# Altium footprint library PartsDatabaseV16.1.PcbLib: 145 footprints (part 6 of 10)
Each footprint in its own frame and in the unit in brackets; x right, y up, seen from the top. Pads: shape width x height; smd on the part's side, far side on the other; paste and mask are expansions set on the pad; w line width, h text height; cw(c..) or ccw(c..) is an arc to the next point about the centre after c.
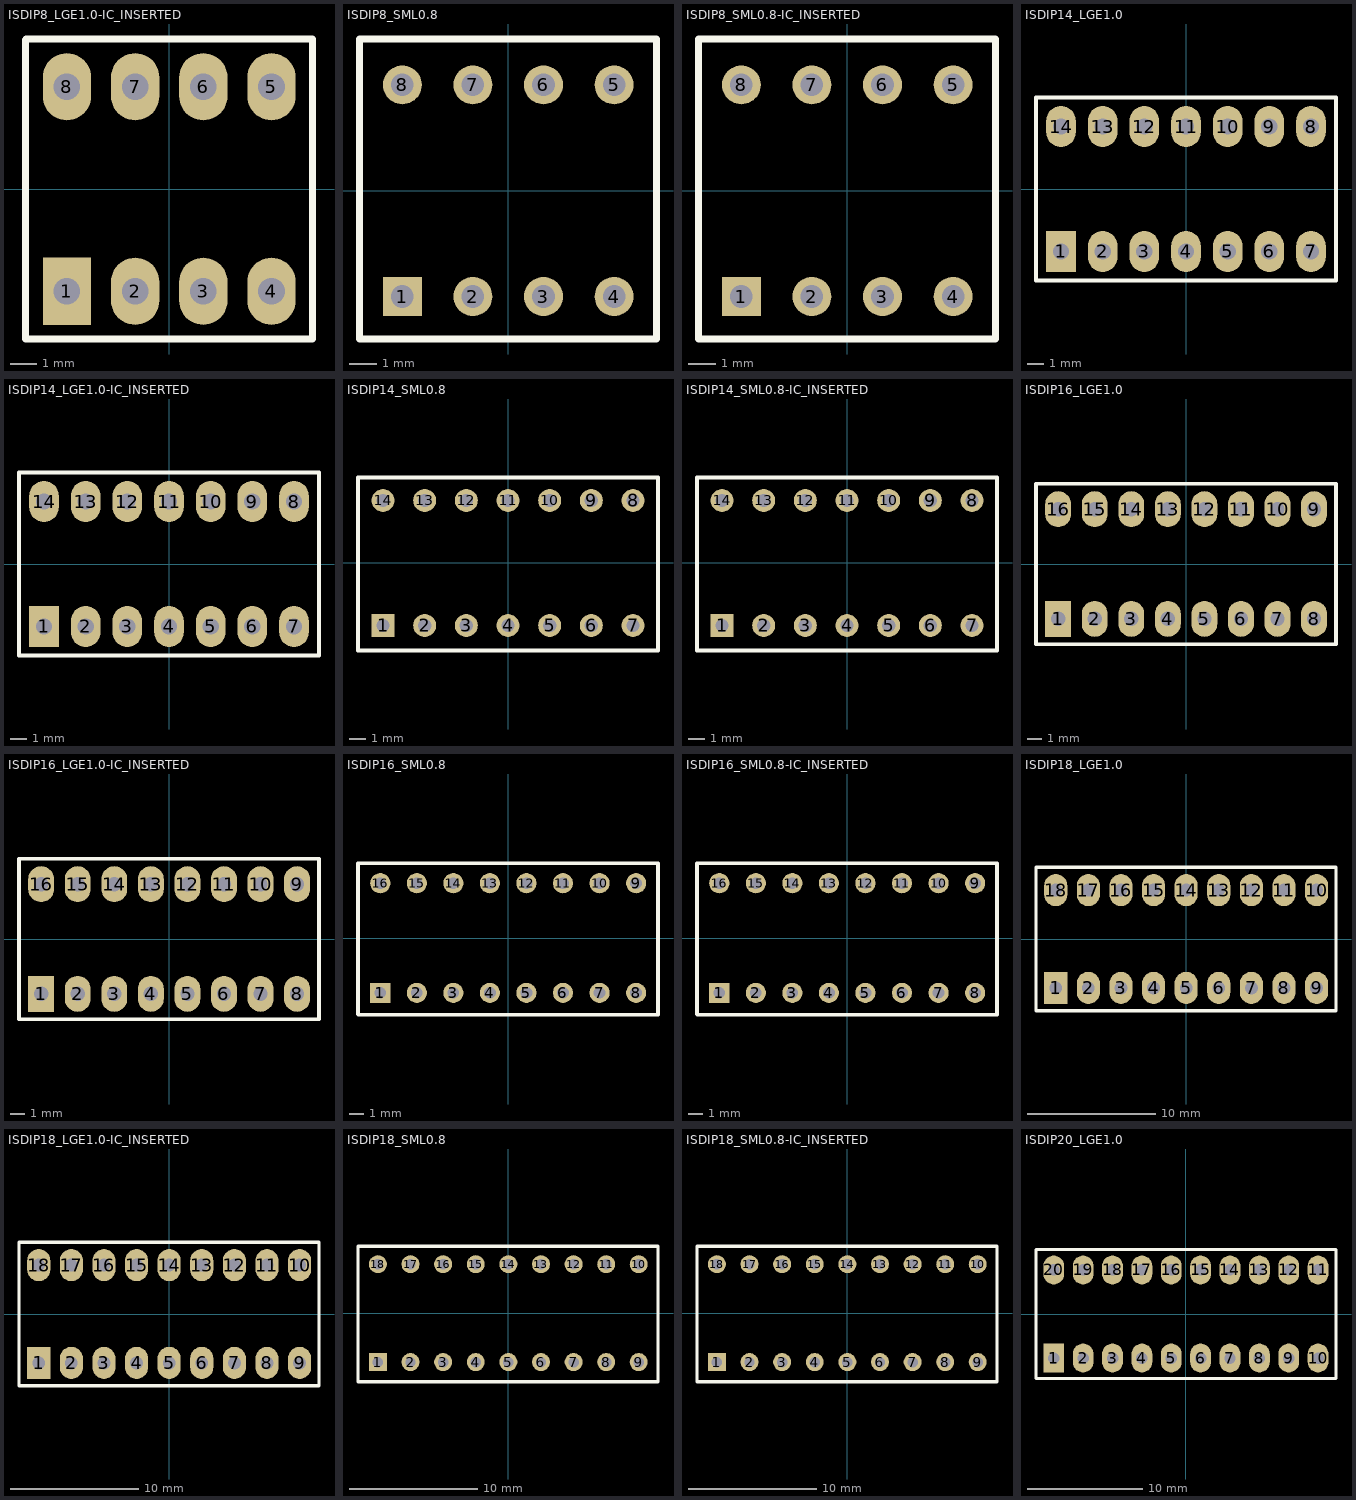
[diagram p5: the footprints below, top view; thin cyan lines are the x and y axes]

## ISDIP8_LGE1.0-IC_INSERTED [mm] "DIP; 8 Rectangular Pins; Row Space 7.62 mm; Pitch 2.54 mm"
height 11.94
pads (8):
  rect 1.8x2.5 hole 0.991: 1(-3.81,-3.81)
  oval 1.8x2.5 hole 0.991: 2(-1.27,-3.81) 3(1.27,-3.81) 4(3.81,-3.81) 5(3.81,3.81) 6(1.27,3.81) 7(-1.27,3.81) 8(-3.81,3.81)
Top Overlay:
  lines w0.25: -5.35,5.563 -5.35,3.175 -5.35,-5.588 5.334,-5.588 5.334,5.588 -5.334,5.588
3D body "DIP8.step": height 8, standoff 1.14, extent -5.664,-4.089 5.766,3.785
3D body "DIP8_socket.step": height 5, standoff -3, extent -5.105,-5.131 5.055,5.029

## ISDIP8_SML0.8 [mm] "DIP; 8 Rectangular Pins; Row Space 7.62 mm; Pitch 2.54 mm"
height 11.94
pads (8):
  rect 1.4x1.4 hole 0.813: 1(-3.81,-3.81)
  round 1.4 hole 0.813: 2(-1.27,-3.81) 3(1.27,-3.81) 4(3.81,-3.81) 5(3.81,3.81) 6(1.27,3.81) 7(-1.27,3.81) 8(-3.81,3.81)
Top Overlay:
  lines w0.25: -5.35,5.461 -5.35,-5.34 5.334,-5.34 ; 5.334,-5.334 5.334,5.461
  lines w0.254: -5.309,5.461 5.334,5.461
3D body "DIP8_socket.step": height 5, standoff -3, extent -5.08,-5.08 5.08,5.08

## ISDIP8_SML0.8-IC_INSERTED [mm] "DIP; 8 Rectangular Pins; Row Space 7.62 mm; Pitch 2.54 mm"
height 11.94
pads (8):
  rect 1.4x1.4 hole 0.813: 1(-3.81,-3.81)
  round 1.4 hole 0.813: 2(-1.27,-3.81) 3(1.27,-3.81) 4(3.81,-3.81) 5(3.81,3.81) 6(1.27,3.81) 7(-1.27,3.81) 8(-3.81,3.81)
Top Overlay:
  lines w0.25: -5.35,5.461 -5.35,-5.34 5.334,-5.34 ; 5.334,-5.334 5.334,5.461
  lines w0.254: -5.309,5.461 5.334,5.461
3D body "DIP8.step": height 8, standoff 1.14, extent -5.702,-3.937 5.728,3.937
3D body "DIP8_socket.step": height 5, standoff -3, extent -5.08,-5.08 5.08,5.08

## ISDIP14_LGE1.0 [mm] "DIP; 14 Rectangular Pins; Row Space 7.62 mm; Pitch 2.54 mm"
height 11.94
pads (14):
  rect 1.8x2.5 hole 0.991: 1(-7.62,-3.81)
  oval 1.8x2.5 hole 0.991: 2(-5.08,-3.81) 3(-2.54,-3.81) 4(0,-3.81) 5(2.54,-3.81) 6(5.08,-3.81) 7(7.62,-3.81) 8(7.62,3.81) 9(5.08,3.81) 10(2.54,3.81) 11(0,3.81) 12(-2.54,3.81) 13(-5.08,3.81) 14(-7.62,3.81)
Top Overlay:
  lines w0.25: -9.144,-5.588 9.144,-5.588 ; -9.142,5.588 9.144,5.588
  lines w0.254: -9.144,-5.588 -9.144,5.588 ; 9.144,-5.588 9.144,5.588
3D body "DIP14_socket.step": height 5, standoff -3, extent -8.814,-5.131 8.966,5.029

## ISDIP14_LGE1.0-IC_INSERTED [mm] "DIP; 14 Rectangular Pins; Row Space 7.62 mm; Pitch 2.54 mm"
height 11.94
pads (14):
  rect 1.8x2.5 hole 0.991: 1(-7.62,-3.81)
  oval 1.8x2.5 hole 0.991: 2(-5.08,-3.81) 3(-2.54,-3.81) 4(0,-3.81) 5(2.54,-3.81) 6(5.08,-3.81) 7(7.62,-3.81) 8(7.62,3.81) 9(5.08,3.81) 10(2.54,3.81) 11(0,3.81) 12(-2.54,3.81) 13(-5.08,3.81) 14(-7.62,3.81)
Top Overlay:
  lines w0.25: -9.144,-5.588 9.144,-5.588 ; -9.142,5.588 9.144,5.588
  lines w0.254: -9.144,-5.588 -9.144,5.588 ; 9.144,-5.588 9.144,5.588
3D body "DIP14_socket.step": height 5, standoff -3, extent -8.814,-5.131 8.966,5.029
3D body "DIP14.step": height 8.84, standoff 1.27, extent -9.75,-3.935 9.75,3.935

## ISDIP14_SML0.8 [mm] "DIP; 14 Rectangular Pins; Row Space 7.62 mm; Pitch 2.54 mm"
height 11.94
pads (14):
  rect 1.4x1.4 hole 0.813: 1(-7.62,-3.81)
  round 1.4 hole 0.813: 2(-5.08,-3.81) 3(-2.54,-3.81) 4(0,-3.81) 5(2.54,-3.81) 6(5.08,-3.81) 7(7.62,-3.81) 8(7.62,3.81) 9(5.08,3.81) 10(2.54,3.81) 11(0,3.81) 12(-2.54,3.81) 13(-5.08,3.81) 14(-7.62,3.81)
Top Overlay:
  lines w0.25: -9.144,-5.334 9.144,-5.334 ; -9.144,5.207 9.144,5.207
  lines w0.254: -9.144,-5.334 -9.144,5.207 ; 9.144,-5.334 9.144,5.207
3D body "DIP14_socket.step": height 5, standoff -3, extent -8.89,-5.105 8.89,5.055

## ISDIP14_SML0.8-IC_INSERTED [mm] "DIP; 14 Rectangular Pins; Row Space 7.62 mm; Pitch 2.54 mm"
height 11.94
pads (14):
  rect 1.4x1.4 hole 0.813: 1(-7.62,-3.81)
  round 1.4 hole 0.813: 2(-5.08,-3.81) 3(-2.54,-3.81) 4(0,-3.81) 5(2.54,-3.81) 6(5.08,-3.81) 7(7.62,-3.81) 8(7.62,3.81) 9(5.08,3.81) 10(2.54,3.81) 11(0,3.81) 12(-2.54,3.81) 13(-5.08,3.81) 14(-7.62,3.81)
Top Overlay:
  lines w0.25: -9.144,-5.334 9.144,-5.334 ; -9.144,5.207 9.144,5.207
  lines w0.254: -9.144,-5.334 -9.144,5.207 ; 9.144,-5.334 9.144,5.207
3D body "DIP14_socket.step": height 5, standoff -3, extent -8.89,-5.105 8.89,5.055
3D body "DIP14.step": height 8.76, standoff 1.19, extent -9.712,-3.948 9.788,3.922

## ISDIP16_LGE1.0 [mm] "DIP; 16 Rectangular Pins; Row Space 7.62 mm; Pitch 2.54 mm"
height 11.94
pads (16):
  rect 1.8x2.5 hole 0.991: 1(-8.89,-3.81)
  oval 1.8x2.5 hole 0.991: 2(-6.35,-3.81) 3(-3.81,-3.81) 4(-1.27,-3.81) 5(1.27,-3.81) 6(3.81,-3.81) 7(6.35,-3.81) 8(8.89,-3.81) 9(8.89,3.81) 10(6.35,3.81) 11(3.81,3.81) 12(1.27,3.81) 13(-1.27,3.81) 14(-3.81,3.81) 15(-6.35,3.81) 16(-8.89,3.81)
Top Overlay:
  lines w0.25: -10.43,-5.588 -10.43,3.175 -10.43,5.588 10.414,5.588 10.414,-5.588 -10.43,-5.588
3D body "DIP16_socket.step": height 5, standoff -3, extent -10.109,-5.004 10.211,5.156

## ISDIP16_LGE1.0-IC_INSERTED [mm] "DIP; 16 Rectangular Pins; Row Space 7.62 mm; Pitch 2.54 mm"
height 11.94
pads (16):
  rect 1.8x2.5 hole 0.991: 1(-8.89,-3.81)
  oval 1.8x2.5 hole 0.991: 2(-6.35,-3.81) 3(-3.81,-3.81) 4(-1.27,-3.81) 5(1.27,-3.81) 6(3.81,-3.81) 7(6.35,-3.81) 8(8.89,-3.81) 9(8.89,3.81) 10(6.35,3.81) 11(3.81,3.81) 12(1.27,3.81) 13(-1.27,3.81) 14(-3.81,3.81) 15(-6.35,3.81) 16(-8.89,3.81)
Top Overlay:
  lines w0.25: -10.43,-5.588 10.414,-5.588 10.414,5.588 -10.43,5.588 -10.43,3.175 -10.43,-5.588
3D body "DIP16.step": height 8.76, standoff 1.19, extent -9.967,-3.933 10.033,3.937
3D body "DIP16_socket.step": height 5, standoff -3, extent -10.16,-5.067 10.16,5.093

## ISDIP16_SML0.8 [mm] "DIP; 16 Rectangular Pins; Row Space 7.62 mm; Pitch 2.54 mm"
height 11.94
pads (16):
  rect 1.4x1.4 hole 0.813: 1(-8.89,-3.81)
  round 1.4 hole 0.813: 2(-6.35,-3.81) 3(-3.81,-3.81) 4(-1.27,-3.81) 5(1.27,-3.81) 6(3.81,-3.81) 7(6.35,-3.81) 8(8.89,-3.81) 9(8.89,3.81) 10(6.35,3.81) 11(3.81,3.81) 12(1.27,3.81) 13(-1.27,3.81) 14(-3.81,3.81) 15(-6.35,3.81) 16(-8.89,3.81)
Top Overlay:
  lines w0.25: -10.43,-5.34 10.414,-5.34 ; -10.414,5.207 10.414,5.207 ; 10.414,-5.334 10.414,5.197
  lines w0.254: -10.439,-5.309 -10.439,5.182
3D body "DIP16_socket.step": height 5, standoff -3, extent -10.16,-5.105 10.16,5.055

## ISDIP16_SML0.8-IC_INSERTED [mm] "DIP; 16 Rectangular Pins; Row Space 7.62 mm; Pitch 2.54 mm"
height 11.94
pads (16):
  rect 1.4x1.4 hole 0.813: 1(-8.89,-3.81)
  round 1.4 hole 0.813: 2(-6.35,-3.81) 3(-3.81,-3.81) 4(-1.27,-3.81) 5(1.27,-3.81) 6(3.81,-3.81) 7(6.35,-3.81) 8(8.89,-3.81) 9(8.89,3.81) 10(6.35,3.81) 11(3.81,3.81) 12(1.27,3.81) 13(-1.27,3.81) 14(-3.81,3.81) 15(-6.35,3.81) 16(-8.89,3.81)
Top Overlay:
  lines w0.25: -10.43,-5.34 10.414,-5.34 ; -10.414,5.207 10.414,5.207 ; 10.414,-5.334 10.414,5.197
  lines w0.254: -10.439,-5.309 -10.439,5.182
3D body "DIP16.step": height 8.76, standoff 1.19, extent -10.013,-3.937 9.987,3.933
3D body "DIP16_socket.step": height 5, standoff -3, extent -10.16,-5.105 10.16,5.055

## ISDIP18_LGE1.0 [mm] "DIP; 16 Rectangular Pins; Row Space 7.62 mm; Pitch 2.54 mm"
height 11.94
pads (18):
  rect 1.8x2.5 hole 0.991: 1(-10.16,-3.81)
  oval 1.8x2.5 hole 0.991: 2(-7.62,-3.81) 3(-5.08,-3.81) 4(-2.54,-3.81) 5(0,-3.81) 6(2.54,-3.81) 7(5.08,-3.81) 8(7.62,-3.81) 9(10.16,-3.81) 10(10.16,3.81) 11(7.62,3.81) 12(5.08,3.81) 13(2.54,3.81) 14(0,3.81) 15(-2.54,3.81) 16(-5.08,3.81) 17(-7.62,3.81) 18(-10.16,3.81)
Top Overlay:
  lines w0.25: -11.7,-5.588 -11.7,3.175 -11.7,5.588 11.671,5.588 11.671,-5.588 -11.7,-5.588
3D body "DIP18_socket.step": height 5, standoff -3, extent -11.493,-5.042 11.367,5.118

## ISDIP18_LGE1.0-IC_INSERTED [mm] "DIP; 16 Rectangular Pins; Row Space 7.62 mm; Pitch 2.54 mm"
height 11.94
pads (18):
  rect 1.8x2.5 hole 0.991: 1(-10.16,-3.81)
  oval 1.8x2.5 hole 0.991: 2(-7.62,-3.81) 3(-5.08,-3.81) 4(-2.54,-3.81) 5(0,-3.81) 6(2.54,-3.81) 7(5.08,-3.81) 8(7.62,-3.81) 9(10.16,-3.81) 10(10.16,3.81) 11(7.62,3.81) 12(5.08,3.81) 13(2.54,3.81) 14(0,3.81) 15(-2.54,3.81) 16(-5.08,3.81) 17(-7.62,3.81) 18(-10.16,3.81)
Top Overlay:
  lines w0.25: -11.7,-5.588 11.671,-5.588 11.671,5.588 -11.7,5.588 -11.7,3.175 -11.7,-5.588
3D body "DIP18.step": height 8.86, standoff 1.29, extent -11.635,-3.77 11.355,4.1
3D body "DIP18_socket.step": height 5, standoff -3, extent -11.493,-5.042 11.367,5.118

## ISDIP18_SML0.8 [mm] "DIP; 16 Rectangular Pins; Row Space 7.62 mm; Pitch 2.54 mm"
height 11.94
pads (18):
  rect 1.4x1.4 hole 0.813: 1(-10.154,-3.81)
  round 1.4 hole 0.813: 2(-7.614,-3.81) 3(-5.074,-3.81) 4(-2.534,-3.81) 5(0.006,-3.81) 6(2.546,-3.81) 7(5.086,-3.81) 8(7.626,-3.81) 9(10.154,-3.81) 10(10.154,3.81) 11(7.626,3.81) 12(5.086,3.81) 13(2.546,3.81) 14(0.006,3.81) 15(-2.534,3.81) 16(-5.074,3.81) 17(-7.614,3.81) 18(-10.154,3.81)
Top Overlay:
  lines w0.25: -11.694,-5.34 11.659,-5.34 11.659,5.207 -11.678,5.207
  lines w0.254: -11.703,-5.309 -11.703,5.182
3D body "DIP18_socket.step": height 5, standoff -3, extent -11.405,-4.991 11.455,5.169

## ISDIP18_SML0.8-IC_INSERTED [mm] "DIP; 16 Rectangular Pins; Row Space 7.62 mm; Pitch 2.54 mm"
height 11.94
pads (18):
  rect 1.4x1.4 hole 0.813: 1(-10.154,-3.81)
  round 1.4 hole 0.813: 2(-7.614,-3.81) 3(-5.074,-3.81) 4(-2.534,-3.81) 5(0.006,-3.81) 6(2.546,-3.81) 7(5.086,-3.81) 8(7.626,-3.81) 9(10.154,-3.81) 10(10.154,3.81) 11(7.626,3.81) 12(5.086,3.81) 13(2.546,3.81) 14(0.006,3.81) 15(-2.534,3.81) 16(-5.074,3.81) 17(-7.614,3.81) 18(-10.154,3.81)
Top Overlay:
  lines w0.25: -11.694,-5.34 11.659,-5.34 11.659,5.207 -11.678,5.207
  lines w0.254: -11.703,-5.309 -11.703,5.182
3D body "DIP18.step": height 8.61, standoff 1.04, extent -11.482,-4.075 11.508,3.795
3D body "DIP18_socket.step": height 5, standoff -3, extent -11.405,-4.991 11.455,5.169

## ISDIP20_LGE1.0 [mm] "DIP; 16 Rectangular Pins; Row Space 7.62 mm; Pitch 2.54 mm"
height 11.94
pads (20):
  rect 1.8x2.5 hole 0.991: 1(-11.43,-3.81)
  oval 1.8x2.5 hole 0.991: 2(-8.89,-3.81) 3(-6.35,-3.81) 4(-3.81,-3.81) 5(-1.27,-3.81) 6(1.27,-3.81) 7(3.81,-3.81) 8(6.35,-3.81) 9(8.89,-3.81) 10(11.43,-3.81) 11(11.43,3.81) 12(8.89,3.81) 13(6.35,3.81) 14(3.81,3.81) 15(1.27,3.81) 16(-1.27,3.81) 17(-3.81,3.81) 18(-6.35,3.81) 19(-8.89,3.81) 20(-11.43,3.81)
Top Overlay:
  lines w0.25: 12.97,-5.588 -12.97,-5.588 -12.97,3.175 -12.97,5.588 12.97,5.588 ; 12.979,-5.588 12.979,5.588
3D body "DIP20_socket.step": height 5, standoff -3, extent -12.763,-5.093 12.637,5.067